# Altium integrated library vh_altium_library.intLib: 963 symbols (part 2 of 5)
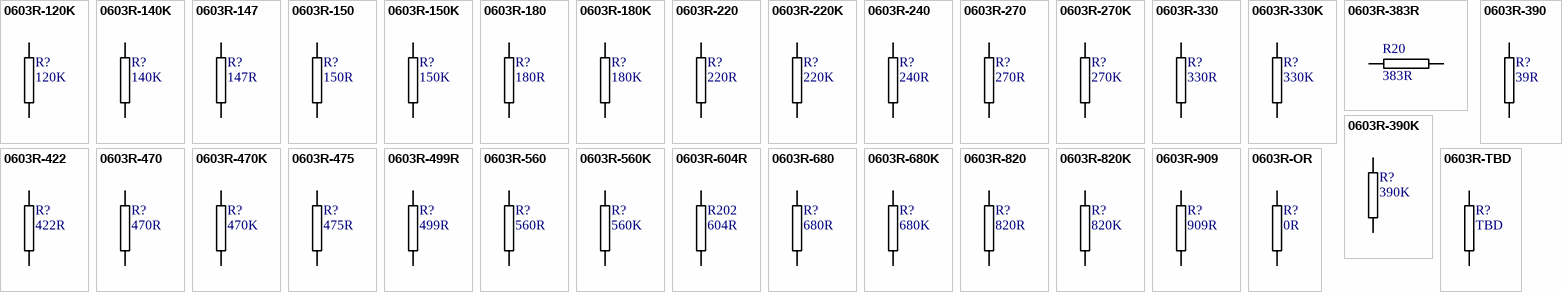
[diagram p69: symbols 0603R-120K to 0603R-TBD]

## 0603R-470K
designator R?, comment 470K
GENERIC RESISTOR 0603; Manufacturer Part Number: RMCF 1/16 470K 1% R; Manufacturer: Stackpole Electronics Inc; Temperature Coefficient: ±100ppm/°C; Description: RES 470K OHM 1/10W 1% 0603 SMD; Tolerance: ±1%; Power (Watts): 0.1W, 1/10W; Supplier 1: Digi-Key; Supplier Part Number 1: RMCF1/16470KFRCT-ND; Supplier Part Number: RMCF1/16470KFRCT-ND; Composition: Thick Film; Category: Resistors; Lead Style: Surface Mount (SMD - SMT); RoHS: RoHS Compliant; Resistance In Ohms: 470K; Case: 0603 (1608 metric); Supplier: Digi-Key; Packaging: Cut Tape (CT)
footprint 0603R-470K (RESISTOR 0603)
pins: 1, 2

## 0603R-475
designator R?, comment 475R
GENERIC RESISTOR 0603; Manufacturer: Stackpole Electronics Inc; Manufacturer Part Number: RMCF 1/16 475 1% R; Description: RES 475 OHM 1/10W 1% 0603 SMD; Temperature Coefficient: ±100ppm/°C; Tolerance: ±1%; Power (Watts): 0.1W, 1/10W; Resistance In Ohms: 475; Reel: R29; Supplier 1: Digi-Key; Supplier Part Number 1: RMCF1/16475FRTR-ND; RoHS: RoHS Compliant; Supplier Part Number: RMCF1/16475FRTR-ND; Category: Resistors; Packaging: Tape & Reel (TR); Lead Style: Surface Mount (SMD - SMT); Supplier: Digi-Key; Case: 0603 (1608 metric); Composition: Thick Film
footprint 0603R-TBD (RESISTOR 0603 VALUE TO BE DETERMINED)
pins: 1, 2

## 0603R-499R
designator R?, comment 499R
GENERIC RESISTOR 0603; Supplier 1: Digi-Key; Supplier Part Number 1: RNCP0603FTD499RTR-ND
footprint 0603R-GENERIC (RESISTOR 0603)
footprint 0603R-NI (RESISTOR 0603 NON INSTALLED)
pins: 1, 2

## 0603R-560
designator R?, comment 560R
GENERIC RESISTOR 0603; Manufacturer: Stackpole Electronics Inc; Manufacturer Part Number: RMC 1/16 560 1% R; Power (Watts): 0.1W, 1/10W; Description: RES TF 1/10W 560 OHM 1% 0603; Resistance In Ohms: 560; Temperature Coefficient: ±100ppm/°C; Tolerance: ±1%; Supplier 1: Digi-Key; Supplier Part Number 1: RMC1/16560FR-ND; Case: 0603 (1608 metric); Lead Style: Surface Mount (SMD - SMT); Composition: Thick Film; Supplier Part Number: RMC1/16560FR-ND; RoHS: RoHS Compliant; Category: Resistors; Supplier: Digi-Key; Packaging: Tape & Reel (TR)
footprint 0603R-560 (RESISTOR 0603)
pins: 1, 2

## 0603R-560K
designator R?, comment 560K
GENERIC RESISTOR 0603; Manufacturer: Stackpole Electronics Inc; Manufacturer Part Number: RMC 1/16 560K 1% R; Temperature Coefficient: ±100ppm/°C; Power (Watts): 0.1W, 1/10W; Tolerance: ±1%; Description: RES TF 1/10W 560K OHM 1% 0603; Supplier 1: Digi-Key; Supplier Part Number 1: RMC1/16560KFR-ND; RoHS: RoHS non-compliant; Packaging: Tape & Reel (TR); Lead Style: Surface Mount (SMD - SMT); Supplier: Digi-Key; Case: 0603 (1608 metric); Supplier Part Number: RMC1/16560KFR-ND; Resistance In Ohms: 560K; Composition: Thick Film; Category: Resistors
footprint 0603R-560K (RESISTOR 0603)
pins: 1, 2

## 0603R-604R
designator R202, comment 604R
GENERIC RESISTOR 0603; REEL: R68; Supplier 1: Digi-Key; Supplier Part Number 1: P604HCT-ND
footprint 0603R-GENERIC (RESISTOR 0603)
pins: 1, 2

## 0603R-680
designator R?, comment 680R
GENERIC RESISTOR 0603; Manufacturer Part Number: RMC 1/16 680 1% R; Manufacturer: Stackpole Electronics Inc; Resistance In Ohms: 680; Description: RES TF 1/10W 680 OHM 1% 0603; Temperature Coefficient: ±100ppm/°C; Tolerance: ±1%; Power (Watts): 0.1W, 1/10W; Supplier 1: Digi-Key; Supplier Part Number 1: RMC1/16680FR-ND; Packaging: Tape & Reel (TR); Supplier: Digi-Key; Composition: Thick Film; Case: 0603 (1608 metric); Category: Resistors; RoHS: RoHS Compliant; Lead Style: Surface Mount (SMD - SMT); Supplier Part Number: RMC1/16680FR-ND
footprint 0603R-680 (RESISTOR 0603)
pins: 1, 2

## 0603R-680K
designator R?, comment 680K
GENERIC RESISTOR 0603; Manufacturer Part Number: RMC 1/16 680K 1% R; Manufacturer: Stackpole Electronics Inc; Description: RES TF 1/10W 680K OHM 1% 0603; Power (Watts): 0.1W, 1/10W; Tolerance: ±1%; Temperature Coefficient: ±100ppm/°C; Supplier 1: Digi-Key; Supplier Part Number 1: RMC1/16680KFR-ND; Case: 0603 (1608 metric); Resistance In Ohms: 680K; Supplier Part Number: RMC1/16680KFR-ND; Composition: Thick Film; Lead Style: Surface Mount (SMD - SMT); Packaging: Tape & Reel (TR); Category: Resistors; Supplier: Digi-Key; RoHS: RoHS Compliant
footprint 0603R-680K (RESISTOR 0603)
pins: 1, 2

## 0603R-820
designator R?, comment 820R
GENERIC RESISTOR 0603; Manufacturer Part Number: RMC 1/16 820 1% R; Manufacturer: Stackpole Electronics Inc; Description: RES TF 1/10W 820 OHM 1% 0603; Power (Watts): 0.1W, 1/10W; Tolerance: ±1%; Resistance In Ohms: 820; Temperature Coefficient: ±100ppm/°C; Supplier 1: Digi-Key; Supplier Part Number 1: RMC1/16820FR-ND; RoHS: RoHS non-compliant; Supplier: Digi-Key; Case: 0603 (1608 metric); Lead Style: Surface Mount (SMD - SMT); Composition: Thick Film; Category: Resistors; Packaging: Tape & Reel (TR); Supplier Part Number: RMC1/16820FR-ND
footprint 0603R-820 (RESISTOR 0603)
pins: 1, 2

## 0603R-820K
designator R?, comment 820K
GENERIC RESISTOR 0603; Manufacturer: Stackpole Electronics Inc; Manufacturer Part Number: RMC 1/16 820K 1% R; Power (Watts): 0.1W, 1/10W; Temperature Coefficient: ±100ppm/°C; Tolerance: ±1%; Description: RES TF 1/10W 820K OHM 1% 0603; Supplier 1: Digi-Key; Supplier Part Number 1: RMC1/16820KFR-ND; Case: 0603 (1608 metric); RoHS: RoHS non-compliant; Supplier Part Number: RMC1/16820KFR-ND; Category: Resistors; Composition: Thick Film; Packaging: Tape & Reel (TR); Lead Style: Surface Mount (SMD - SMT); Resistance In Ohms: 820K; Supplier: Digi-Key
footprint 0603R-GENERIC (RESISTOR 0603)
pins: 1, 2

## 0603R-909
designator R?, comment 909R
GENERIC RESISTOR 0603; Manufacturer: Stackpole Electronics Inc; Manufacturer Part Number: RMC 1/16 909 1% R; Description: RES TF 1/10W 909 OHM 1% 0603; Temperature Coefficient: ±100ppm/°C; Resistance In Ohms: 909; Tolerance: ±1%; Power (Watts): 0.1W, 1/10W; Reel: R25; Supplier 1: Digi-Key; Supplier Part Number 1: RMC1/16909FR-ND; Supplier Part Number: RMC1/16909FR-ND; Category: Resistors; RoHS: RoHS non-compliant; Composition: Thick Film; Lead Style: Surface Mount (SMD - SMT); Packaging: Tape & Reel (TR); Supplier: Digi-Key; Case: 0603 (1608 metric)
footprint 0603R-909 (Footprint not found)
pins: 1, 2

## 0603R-OR
designator R?, comment 0R
GENERIC JUMPER 0603; Manufacturer: Stackpole Electronics Inc; Manufacturer Part Number: RMC 1/16 0 G; Description: RES TF 1/10W 5% 0603; Reel: R26; Supplier 1: Digi-Key; Supplier Part Number 1: RMCF0603ZT0R00TR-ND
footprint 0603R-0R (RESISTOR 0603)
footprint 0603R-NI (RESISTOR 0603 NON INSTALLED)
pins: 1, 2

## 0603R-TBD
designator R?, comment TBD
RESISTOR 0603 VALUE TO BE DETERMINED
footprint 0603R-TBD (RESISTOR 0603 VALUE TO BE DETERMINED)
pins: 1, 2


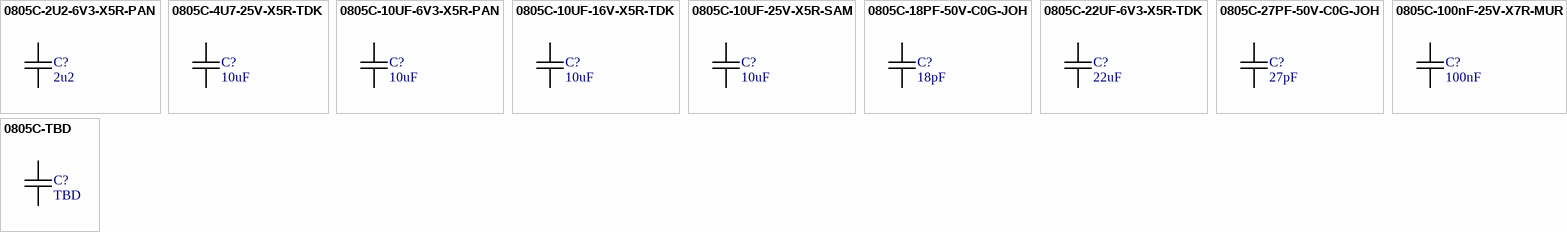
[diagram p8: symbols 0805C-2U2-6V3-X5R-PAN to 0805C-TBD]

## 0805C-2U2-6V3-X5R-PAN
designator C?, comment 2u2
CAPACITOR 0805 CERAMIC; Manufacturer Part Number: ECJ-1VB0J225K; Manufacturer: Panasonic - ECG; Description: CAP 2.2UF 6.3V CERAMIC X5R 0603; Reel: C7; Supplier 1: Digi-Key; Supplier Part Number 1: PCC2273TR-ND
footprint 0805C-GENERIC (CAPACITOR 0805)
pins: 1, 2

## 0805C-4U7-25V-X5R-TDK
designator C?, comment 10uF
CAPACITOR 0805 CERAMIC; Manufacturer: TDK Corporation; Manufacturer Part Number: C2012X5R1E475K; Tolerance: ±10%; Voltage - Rated: 25V; Temperature Coefficient: X5R; Capacitance: 4.7µF; Description: CAP CER 4.7UF 25V X5R 0805; REEL: C102; Supplier 1: Digi-Key; Supplier Part Number 1: 445-4116-1-ND; Packaging: Cut Tape (CT); Operating Temperature: -55°C ~ 85°C; Supplier: Digi-Key; Thickness: 1.25mm; RoHS: RoHS Compliant; Features: General Purpose; Mounting Type: Surface Mount, MLCC; Package / Case: 0805 (2012 Metric); Lead Spacing: -; Category: Capacitors; Supplier Part Number: 445-4116-1-ND
footprint 0805C-GENERIC (CAPACITOR 0805)
pins: 1, 2

## 0805C-10UF-6V3-X5R-PAN
designator C?, comment 10uF
CAPACITOR 0805 CERAMIC; Manufacturer: Panasonic - ECG; Manufacturer Part Number: ECJ-2FB0J106M; Reel: C1; Capacitance: 10µF; Voltage - Rated: 6.3V; Temperature Coefficient: X5R; Tolerance: ±20%; Description: CAP 10UF 6.3V CERAMIC X5R 0805; Supplier 1: Digi-Key; Supplier Part Number 1: PCC2225TR-ND; Supplier: Digi-Key; Operating Temperature: -55°C ~ 85°C; Mounting Type: Surface Mount, MLCC; Lead Spacing: -; RoHS: RoHS Compliant; Packaging: Tape & Reel (TR); Thickness: 1.25mm; Package / Case: 0805 (2012 metric); Features: General Purpose; Category: Capacitors; Supplier Part Number: PCC2225TR-ND
footprint 0805C-GENERIC (CAPACITOR 0805)
pins: 1, 2

## 0805C-10UF-16V-X5R-TDK
designator C?, comment 10uF
CAPACITOR 0805 CERAMIC; Manufacturer Part Number: C2012X5R1C106M; Manufacturer: TDK Corporation; REEL: C63; Description: CAP CER 10UF 16V X5R 0805; Supplier 1: Digi-Key; Supplier Part Number 1: 445-4115-2-ND
footprint 0805C-GENERIC (CAPACITOR 0805)
pins: 1, 2

## 0805C-10UF-25V-X5R-SAM
designator C?, comment 10uF
CAPACITOR 0805 CERAMIC; Manufacturer 1: Samsung; Manufacturer Part Number 1: CL21A106KACLRNC; Reel: C19; Supplier Part Number 1: CL21A106KACLRNC; Supplierr 1: Samsung
footprint 0805C-GENERIC (CAPACITOR 0805)
pins: 1, 2

## 0805C-18PF-50V-C0G-JOH
designator C?, comment 18pF
CAPACITOR 0805 CERAMIC; Supplier 1: Digi-Key; Supplier Part Number 1: 709-1171-2-ND
footprint 0805C-TBD (CAPACITOR 0805)
pins: 1, 2

## 0805C-22UF-6V3-X5R-TDK
designator C?, comment 22uF
CAPACITOR 0805 CERAMIC; Manufacturer: TDK Corporation; Manufacturer Part Number: C2012X5R0J226M; Tolerance: ±20%; Capacitance: 22µF; Description: CAP CER 22UF 6.3V X5R 20% 0805; Temperature Coefficient: X5R; Voltage - Rated: 6.3V; Supplier 1: Digi-Key; Supplier Part Number 1: 445-1422-2-ND; Operating Temperature: -55°C ~ 85°C; Mounting Type: Surface Mount, MLCC; RoHS: RoHS Compliant; Packaging: Tape & Reel (TR); Features: General Purpose; Lead Spacing: -; Category: Capacitors; Thickness: 1.25mm; Package / Case: 0805 (2012 Metric); Supplier Part Number: 445-1422-2-ND; Supplier: Digi-Key
footprint 0805C-GENERIC (CAPACITOR 0805)
pins: 1, 2

## 0805C-27PF-50V-C0G-JOH
designator C?, comment 27pF
CAPACITOR 0805 CERAMIC; Supplier 1: Digi-Key; Supplier 2: Digi-Key; Supplier Part Number 2: 251R15S270FV4E-ND
footprint 0805C-TBD (CAPACITOR 0805)
pins: 1, 2

## 0805C-100nF-25V-X7R-MUR
designator C?, comment 100nF
CAPACITOR 0805 CERAMIC; Supplier 1: Digi-Key; Supplier Part Number 1: 490-1673-1-ND
footprint 0805C-TBD (CAPACITOR 0805)
pins: 1, 2

## 0805C-TBD
designator C?, comment TBD
CAPACITOR 0805 CERAMIC VALUE TO BE DETERMINED
footprint 0805C-TBD (CAPACITOR 0805)
pins: 1, 2


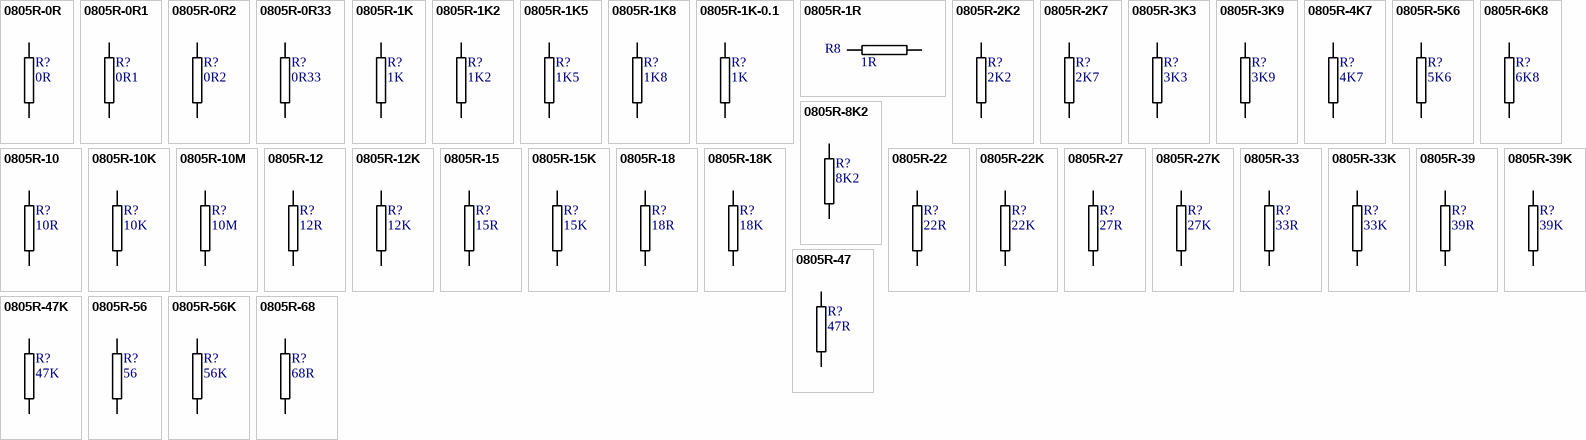
[diagram p9: symbols 0805R-0R to 0805R-68]

## 0805R-0R
designator R?, comment 0R
RESISTOR 0805 1 WATT
footprint 0805R-GENERIC (RESISTOR 0805)
pins: 1, 2

## 0805R-0R1
designator R?, comment 0R1
RESISTOR 0805 1 WATT; Manufacturer Part Number: RL1220S-R10-F; Manufacturer: Susumu; Description: RES .10 OHM 1/4W 1% 0805 SMD; Reel: *; Supplier 1: Digi-Key; Supplier Part Number 1: RL12S.10FTR-ND
footprint 0805R-0R1 (Footprint not found)
pins: 1, 2

## 0805R-0R2
designator R?, comment 0R2
RESISTOR 0805 1 WATT; Reel: *; Supplier 1: Digi-Key; Supplier Part Number 1: 311-.20STR-ND
footprint 0805R-0R1 (Footprint not found)
pins: 1, 2

## 0805R-0R33
designator R?, comment 0R33
RESISTOR 0805 1 WATT; Reel: *; Supplier 1: Digi-Key; Supplier Part Number 1: 311-.33STR-ND
footprint 0805R-0R1 (Footprint not found)
pins: 1, 2

## 0805R-1K
designator R?, comment 1K
RESISTOR 0805 1/4 WATT THIN FILM; Reel: *
footprint 0805R-1K (RESISTOR 0805)
pins: 1, 2

## 0805R-1K2
designator R?, comment 1K2
RESISTOR 0805 1/4 WATT THIN FILM; Reel: *
footprint 0805R-1K2 (RESISTOR 0805)
pins: 1, 2

## 0805R-1K5
designator R?, comment 1K5
RESISTOR 0805 1/4 WATT THIN FILM; Reel: *
footprint 0805R-1K5 (RESISTOR 0805)
pins: 1, 2

## 0805R-1K8
designator R?, comment 1K8
RESISTOR 0805 1/4 WATT THIN FILM; Reel: *
footprint 0805R-1K8 (RESISTOR 0805)
pins: 1, 2

## 0805R-1K-0.1
designator R?, comment 1K
RESISTOR 0805 1/4 WATT THIN FILM 0.1%; Reel: *
footprint 0805R-1K (RESISTOR 0805)
pins: 1, 2

## 0805R-1R
designator R8, comment 1R
RESISTOR 0805 1/3 WATT; REEL: R84; Supplier 1: Digi-Key; Supplier Part Number 1: 541-1.0TADKR-ND
footprint 0805R-GENERIC (RESISTOR 0805)
pins: 1, 2

## 0805R-2K2
designator R?, comment 2K2
RESISTOR 0805 1/4 WATT THIN FILM; Reel: *
footprint 0805R-2K2 (RESISTOR 0805)
pins: 1, 2

## 0805R-2K7
designator R?, comment 2K7
RESISTOR 0805 1/4 WATT THIN FILM; Reel: *
footprint 0805R-2K7 (RESISTOR 0805)
pins: 1, 2

## 0805R-3K3
designator R?, comment 3K3
RESISTOR 0805 1/4 WATT THIN FILM; Reel: *
footprint 0805R-3K3 (RESISTOR 0805)
pins: 1, 2

## 0805R-3K9
designator R?, comment 3K9
RESISTOR 0805 1/4 WATT THIN FILM; Reel: *
footprint 0805R-3K9 (RESISTOR 0805)
pins: 1, 2

## 0805R-4K7
designator R?, comment 4K7
RESISTOR 0805 1/4 WATT THIN FILM; Reel: *
footprint 0805R-4K7 (RESISTOR 0805)
pins: 1, 2

## 0805R-5K6
designator R?, comment 5K6
RESISTOR 0805 1/4 WATT THIN FILM; Reel: *
footprint 0805R-5K6 (RESISTOR 0805)
pins: 1, 2

## 0805R-6K8
designator R?, comment 6K8
RESISTOR 0805 1/4 WATT THIN FILM; Reel: *
footprint 0805R-6K8 (RESISTOR 0805)
pins: 1, 2

## 0805R-8K2
designator R?, comment 8K2
RESISTOR 0805 1/4 WATT THIN FILM; Reel: *
footprint 0805R-8K2 (RESISTOR 0805)
pins: 1, 2

## 0805R-10
designator R?, comment 10R
RESISTOR 0805 1/4 WATT THIN FILM; Reel: *
footprint 0805R-10 (RESISTOR 0805)
pins: 1, 2

## 0805R-10K
designator R?, comment 10K
RESISTOR 0805 1/4 WATT THIN FILM; Reel: *
footprint 0805R-10K (RESISTOR 0805)
pins: 1, 2

## 0805R-10M
designator R?, comment 10M
RESISTOR 0805 VALUE TO BE DETERMINED; Supplier 1: Digi-Key; Supplier Part Number 1: HVCB0805FKL10M0-ND
footprint 0805R-TBD (RESISTOR 0805 VALUE TO BE DETERMINED)
pins: 1, 2

## 0805R-12
designator R?, comment 12R
RESISTOR 0805 1/4 WATT THIN FILM; Reel: *
footprint 0805R-12 (RESISTOR 0805)
pins: 1, 2

## 0805R-12K
designator R?, comment 12K
RESISTOR 0805 1/4 WATT THIN FILM; Reel: *
footprint 0805R-12K (RESISTOR 0805)
pins: 1, 2

## 0805R-15
designator R?, comment 15R
RESISTOR 0805 1/4 WATT THIN FILM; Reel: *
footprint 0805R-15 (RESISTOR 0805)
pins: 1, 2

## 0805R-15K
designator R?, comment 15K
RESISTOR 0805 1/4 WATT THIN FILM; Reel: *
footprint 0805R-15K (RESISTOR 0805)
pins: 1, 2

## 0805R-18
designator R?, comment 18R
RESISTOR 0805 1/4 WATT THIN FILM; Reel: *
footprint 0805R-18 (RESISTOR 0805)
pins: 1, 2

## 0805R-18K
designator R?, comment 18K
RESISTOR 0805 1/4 WATT THIN FILM; Reel: *
footprint 0805R-18K (RESISTOR 0805)
pins: 1, 2

## 0805R-22
designator R?, comment 22R
RESISTOR 0805 1/4 WATT THIN FILM; Reel: *
footprint 0805R-22 (RESISTOR 0805)
pins: 1, 2

## 0805R-22K
designator R?, comment 22K
RESISTOR 0805 1/4 WATT THIN FILM; Reel: *
footprint 0805R-22K (RESISTOR 0805)
pins: 1, 2

## 0805R-27
designator R?, comment 27R
RESISTOR 0805 1/4 WATT THIN FILM; Reel: *
footprint 0805R-27 (RESISTOR 0805)
pins: 1, 2

## 0805R-27K
designator R?, comment 27K
RESISTOR 0805 1/4 WATT THIN FILM; Reel: *
footprint 0805R-27K (RESISTOR 0805)
pins: 1, 2

## 0805R-33
designator R?, comment 33R
RESISTOR 0805 1/4 WATT THIN FILM; Reel: *
footprint 0805R-33 (RESISTOR 0805)
pins: 1, 2

## 0805R-33K
designator R?, comment 33K
RESISTOR 0805 1/4 WATT THIN FILM; Reel: *
footprint 0805R-33K (RESISTOR 0805)
pins: 1, 2

## 0805R-39
designator R?, comment 39R
RESISTOR 0805 1/4 WATT THIN FILM; Reel: *
footprint 0805R-39 (RESISTOR 0805)
pins: 1, 2

## 0805R-39K
designator R?, comment 39K
RESISTOR 0805 1/4 WATT THIN FILM; Reel: R85; Supplier 1: Digi-Key; Supplier Part Number 1: P39.0KHTR-ND
footprint 0805R-39K (RESISTOR 0805)
pins: 1, 2

## 0805R-47
designator R?, comment 47R
RESISTOR 0805 1/4 WATT THIN FILM; Reel: *
footprint 0805R-47 (RESISTOR 0805)
pins: 1, 2

## 0805R-47K
designator R?, comment 47K
RESISTOR 0805 1/4 WATT THIN FILM
footprint 0805R-47K (RESISTOR 0805)
pins: 1, 2

## 0805R-56
designator R?, comment 56
RESISTOR 0805 1/4 WATT THIN FILM; Reel: *
footprint 0805R-56 (RESISTOR 0805)
pins: 1, 2

## 0805R-56K
designator R?, comment 56K
RESISTOR 0805 1/4 WATT THIN FILM; Reel: *
footprint 0805R-56K (RESISTOR 0805)
pins: 1, 2

## 0805R-68
designator R?, comment 68R
RESISTOR 0805 1/4 WATT THIN FILM; Reel: *
footprint 0805R-68 (RESISTOR 0805)
pins: 1, 2

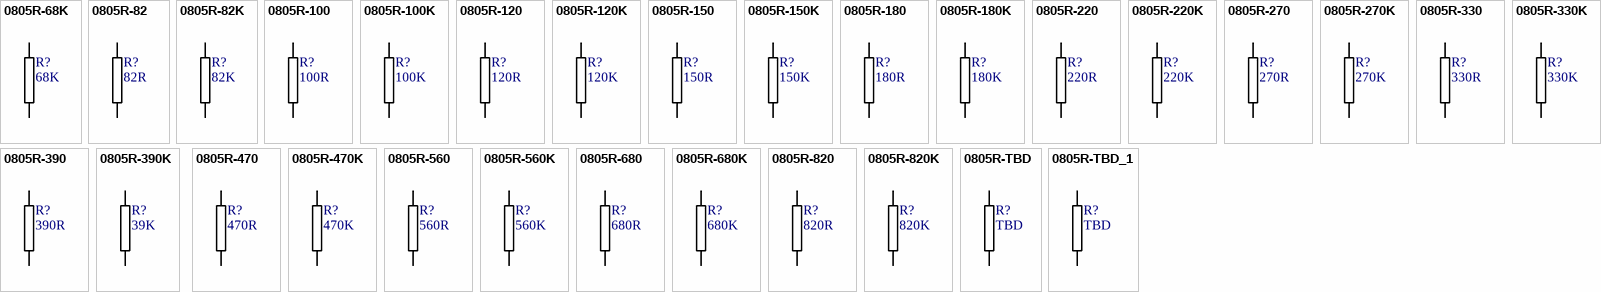
[diagram p10: symbols 0805R-68K to 0805R-TBD_1]

## 0805R-68K
designator R?, comment 68K
RESISTOR 0805 1/4 WATT THIN FILM; Reel: *
footprint 0805R-68K (RESISTOR 0805)
pins: 1, 2

## 0805R-82
designator R?, comment 82R
RESISTOR 0805 1/4 WATT THIN FILM; Reel: *
footprint 0805R-82K (RESISTOR 0805)
pins: 1, 2

## 0805R-82K
designator R?, comment 82K
RESISTOR 0805 1/4 WATT THIN FILM; Reel: *
footprint 0805R-82K (RESISTOR 0805)
pins: 1, 2

## 0805R-100
designator R?, comment 100R
RESISTOR 0805 1/4 WATT THIN FILM; Reel: *
footprint 0805R-100 (RESISTOR 0805)
pins: 1, 2

## 0805R-100K
designator R?, comment 100K
RESISTOR 0805 1/4 WATT THIN FILM; Reel: *; Supplier 1: Digi-Key; Supplier Part Number 1: RMCF0805FT100KTR-ND
footprint 0805R-100K (RESISTOR 0805)
pins: 1, 2

## 0805R-120
designator R?, comment 120R
RESISTOR 0805 1/4 WATT THIN FILM; Reel: *
footprint 0805R-120 (RESISTOR 0805)
pins: 1, 2

## 0805R-120K
designator R?, comment 120K
RESISTOR 0805 1/4 WATT THIN FILM; Reel: *
footprint 0805R-120K (RESISTOR 0805)
pins: 1, 2

## 0805R-150
designator R?, comment 150R
RESISTOR 0805 1/4 WATT THIN FILM; Reel: *
footprint 0805R-150 (RESISTOR 0805)
pins: 1, 2

## 0805R-150K
designator R?, comment 150K
RESISTOR 0805 1/4 WATT THIN FILM; Reel: *
footprint 0805R-150K (RESISTOR 0805)
pins: 1, 2

## 0805R-180
designator R?, comment 180R
RESISTOR 0805 1/4 WATT THIN FILM; Reel: *
footprint 0805R-180 (RESISTOR 0805)
pins: 1, 2

## 0805R-180K
designator R?, comment 180K
RESISTOR 0805 1/4 WATT THIN FILM; Reel: *
footprint 0805R-180K (RESISTOR 0805)
pins: 1, 2

## 0805R-220
designator R?, comment 220R
RESISTOR 0805 1/4 WATT THIN FILM; Reel: *
footprint 0805R-220 (RESISTOR 0805)
pins: 1, 2

## 0805R-220K
designator R?, comment 220K
RESISTOR 0805 1/4 WATT THIN FILM; Reel: *
footprint 0805R-220K (RESISTOR 0805)
pins: 1, 2

## 0805R-270
designator R?, comment 270R
RESISTOR 0805 1/4 WATT THIN FILM; Reel: *
footprint 0805R-270 (RESISTOR 0805)
pins: 1, 2

## 0805R-270K
designator R?, comment 270K
RESISTOR 0805 1/4 WATT THIN FILM; Reel: *
footprint 0805R-270K (RESISTOR 0805)
pins: 1, 2

## 0805R-330
designator R?, comment 330R
RESISTOR 0805 1/4 WATT THIN FILM; Reel: *
footprint 0805R-330 (RESISTOR 0805)
pins: 1, 2

## 0805R-330K
designator R?, comment 330K
RESISTOR 0805 1/4 WATT THIN FILM; Reel: *
footprint 0805R-330K (RESISTOR 0805)
pins: 1, 2

## 0805R-390
designator R?, comment 390R
RESISTOR 0805 1/4 WATT THIN FILM; Reel: *
footprint 0805R-390 (RESISTOR 0805)
pins: 1, 2

## 0805R-390K
designator R?, comment 39K
RESISTOR 0805 1/4 WATT THIN FILM; Reel: *
footprint 0805R-390K (RESISTOR 0805)
pins: 1, 2

## 0805R-470
designator R?, comment 470R
RESISTOR 0805 1/4 WATT THIN FILM; Reel: *
footprint 0805R-470 (RESISTOR 0805)
pins: 1, 2

## 0805R-470K
designator R?, comment 470K
RESISTOR 0805 1/4 WATT THIN FILM; Reel: *
footprint 0805R-470K (RESISTOR 0805)
pins: 1, 2

## 0805R-560
designator R?, comment 560R
RESISTOR 0805 1/4 WATT THIN FILM; Reel: *
footprint 0805R-560 (RESISTOR 0805)
pins: 1, 2

## 0805R-560K
designator R?, comment 560K
RESISTOR 0805 1/4 WATT THIN FILM; Reel: *
footprint 0805R-560K (RESISTOR 0805)
pins: 1, 2

## 0805R-680
designator R?, comment 680R
RESISTOR 0805 1/4 WATT THIN FILM; Reel: *
footprint 0805R-680 (RESISTOR 0805)
pins: 1, 2

## 0805R-680K
designator R?, comment 680K
RESISTOR 0805 1/4 WATT THIN FILM; Reel: *
footprint 0805R-680K (RESISTOR 0805)
pins: 1, 2

## 0805R-820
designator R?, comment 820R
RESISTOR 0805 1/4 WATT THIN FILM; Reel: *
footprint 0805R-820 (RESISTOR 0805)
pins: 1, 2

## 0805R-820K
designator R?, comment 820K
RESISTOR 0805 1/4 WATT THIN FILM; Reel: *
footprint 0805R-820K (RESISTOR 0805)
pins: 1, 2

## 0805R-TBD
designator R?, comment TBD
RESISTOR 0805 VALUE TO BE DETERMINED
footprint 0805R-TBD (RESISTOR 0805 VALUE TO BE DETERMINED)
pins: 1, 2

## 0805R-TBD_1
designator R?, comment TBD
RESISTOR 0805 VALUE TO BE DETERMINED
footprint 0805R-TBD (RESISTOR 0805 VALUE TO BE DETERMINED)
pins: 1, 2


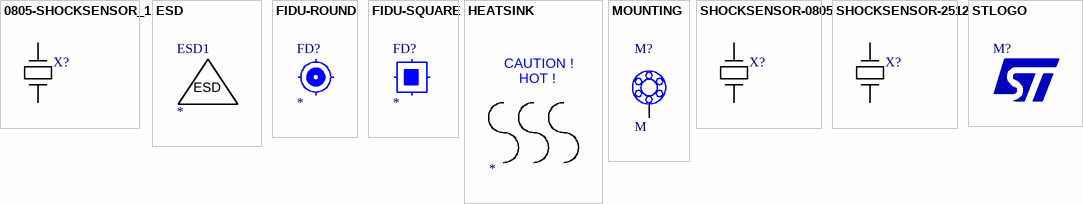
[diagram p11: symbols 0805-SHOCKSENSOR_1 to STLOGO]

## 0805-SHOCKSENSOR_1
designator X?
DO NOT USE : USE SHOCKSENSOR-0805 SYMBOL
footprint 0805-SHOCKSENSOR (SHOCKSENSOR)
pins: 1, 2

## ESD
designator ESD1  (no BOM)
ESD LOGO
footprint ESDSILK

## FIDU-ROUND
designator FD?  (no BOM)
ROUND FIDUCIAL
footprint FIDU-ROUND

## FIDU-SQUARE
designator FD?  (no BOM)
SQUARE FIDUCIAL
footprint FIDU-SQUARE

## HEATSINK
designator ?
text: CAUTION !; HOT !

## MOUNTING
designator M?, comment M  (no BOM)
MOUNTING HOLE - NON INSTALLABLE
footprint MOUNTING
pins: 1, 2, 3, 4, 5, 6, 7

## SHOCKSENSOR-0805
designator X?
SHOCK SENSOR
footprint SHOCKSENSOR-0805 (SHOCKSENSOR)
pins: 1, 2

## SHOCKSENSOR-2512
designator X?
SHOCK SENSOR
footprint SHOCKSENSOR-2512 (SHOCKSENSOR)
pins: 1, 2

## STLOGO
designator M?  (value not drawn)  (no BOM)
footprint STLOGO-SILVER
footprint STLOGO-MINI-SILVER


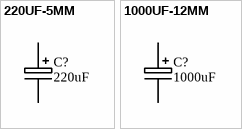
[diagram p12: symbols 220UF-5MM to 1000UF-12MM]

## 220UF-5MM
designator C?, comment 220uF
CAPACITOR POLARISED
footprint C+5MM
pins: +, -

## 1000UF-12MM
designator C?, comment 1000uF
CAPACITOR POLARISED
footprint C+12MM
pins: +, -


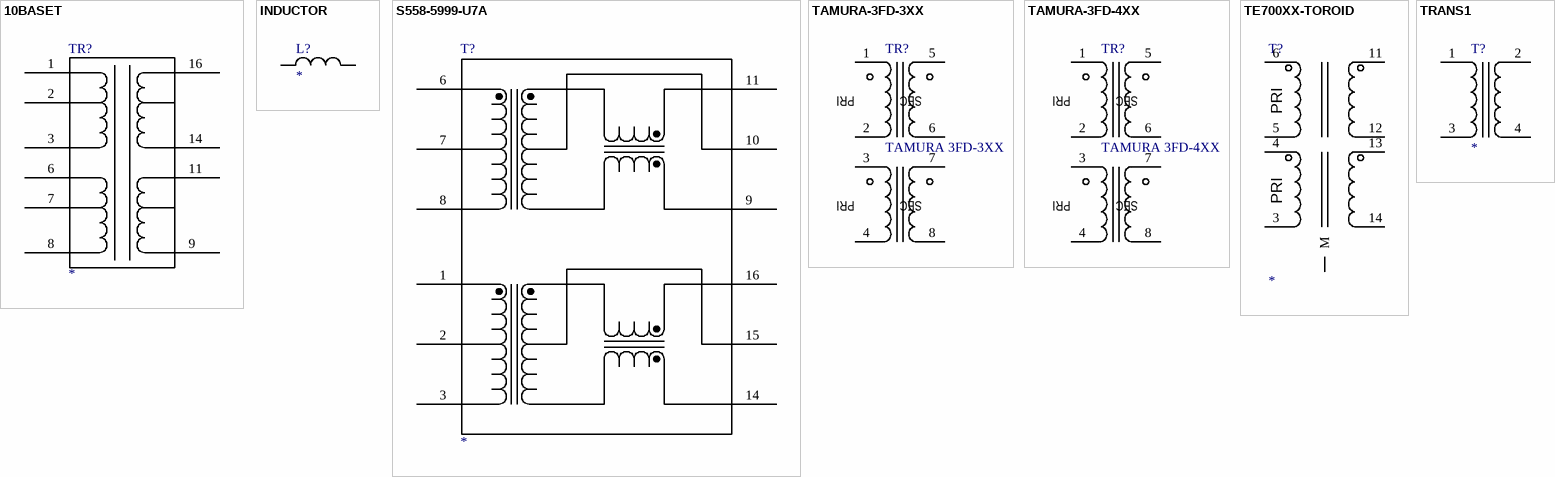
[diagram p13: symbols 10BASET to TRANS1]

## 10BASET
designator TR?
THERNET TRANSFORMER
pins: 1, 2, 3, 6, 7, 8, 9, 11, 14, 16

## INDUCTOR
designator L?
INDUCTOR
pins: 1, 2

## S558-5999-U7A
designator T?
Magnetics, 10/100Base-T, 1CT:1CT Tx and Rx; Supplier 1: Digi-Key; Supplier Part Number 1: 507-1463-2-ND
pins: 1, 2, 3, 6, 7, 8, 9, 10, 11, 14, 15, 16

## TAMURA-3FD-3XX
designator TR?, comment TAMURA 3FD-3XX
footprint TAMURA-3FD-3XX
pins: 1, 2, 3, 4, 5, 6, 7, 8
text: PRI; SEC

## TAMURA-3FD-4XX
designator TR?, comment TAMURA 3FD-4XX
footprint TAMURA-3FD-4XX
pins: 1, 2, 3, 4, 5, 6, 7, 8
text: PRI; SEC

## TE700XX-TOROID
designator T?
AMVECO POTTED TOROIDAL TRANSFORMER
footprint TE70035
pins: 3, 4, 5, 6, 11, 12, 13, 14, M
text: PRI

## TRANS1
designator T?
pins: 1, 2, 3, 4


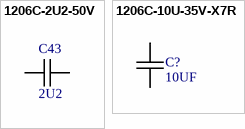
[diagram p14: symbols 1206C-2U2-50V to 1206C-10U-35V-X7R]

## 1206C-2U2-50V
designator C43, comment 2U2
CAPACITOR 0603 CERAMIC; REEL: C100; Supplier 1: Digi-Key; Supplier Part Number 1: 490-4796-2-ND
footprint 1206C-GENERIC
pins: 1, 2

## 1206C-10U-35V-X7R
designator C?, comment 10UF
GENERIC CAPACITOR NON POLARISED 1206; Manufacturer Part Number: GMK316F106ZL-T; Manufacturer: Taiyo Yuden; Reel: C90; Description: CAP CER 10UF 35V Y5V 1206; Supplier 1: Digi-Key; Supplier Part Number 1: 587-1352-2-ND
footprint 1206C-GENERIC
pins: 1, 2


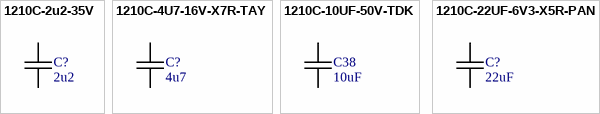
[diagram p15: symbols 1210C-2u2-35V to 1210C-22UF-6V3-X5R-PAN]

## 1210C-2u2-35V
designator C?, comment 2u2
GENERIC CAPACITOR NON POLARISED 1210; Manufacturer: Panasonic - ECG; Manufacturer Part Number: ECJ-4YB0J226M; Reel: C25; Description: CAP 22UF 6.3V CERAMIC 1210 X5R; Supplier 1: Digi-Key; Supplier Part Number 1: 587-2255-2-ND
footprint 1210C-GENERIC
pins: 1, 2

## 1210C-4U7-16V-X7R-TAY
designator C?, comment 4u7
GENERIC CAPACITOR NON POLARISED 1210; Manufacturer: Taiyo Yuden; Manufacturer Part Number: EMK325B7475KN-T; Reel: C38; Description: CAP CER 4.7UF 16V X7R 1210; Supplier 1: Digi-Key; Supplier Part Number 1: 587-1392-2-ND
footprint 1210C-GENERIC
pins: 1, 2

## 1210C-10UF-50V-TDK
designator C38, comment 10uF
GENERIC CAPACITOR NON POLARISED 1210; REEL: C87; Supplier 1: Digi-Key; Supplier Part Number 1: 445-4537-2-ND
footprint 1210C-GENERIC
pins: 1, 2

## 1210C-22UF-6V3-X5R-PAN
designator C?, comment 22uF
GENERIC CAPACITOR NON POLARISED 1210; Manufacturer: Panasonic - ECG; Manufacturer Part Number: ECJ-4YB0J226M; Reel: C25; Description: CAP 22UF 6.3V CERAMIC 1210 X5R; Supplier 1: Digi-Key; Supplier Part Number 1: PCC2179TR-ND
footprint 1210C-GENERIC
pins: 1, 2


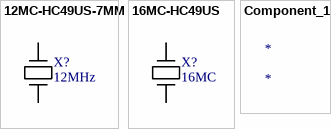
[diagram p16: symbols 12MC-HC49US-7MM to Component_1]

## 12MC-HC49US-7MM
designator X?, comment 12MHz
12MHz CRYSTAL HC49US SHORT BODY; Supplier 1: Mouser; Supplier Part Number 1: 520-120-20-3XT
footprint XTAL-HC49US-7MM (Footprint not found)
pins: 1, 2

## 16MC-HC49US
designator X?, comment 16MC
16MHZ CRSYTAL HC49US; Supplier 1: Mouser; Supplier Part Number 1: 815-ABLS-16.0M-T
footprint XTAL-RU49/4
pins: 1, 2

## Component_1
designator *


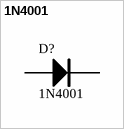
[diagram p17: symbol 1N4001]

## 1N4001
designator D?
footprint 1N400X
pins: A, K


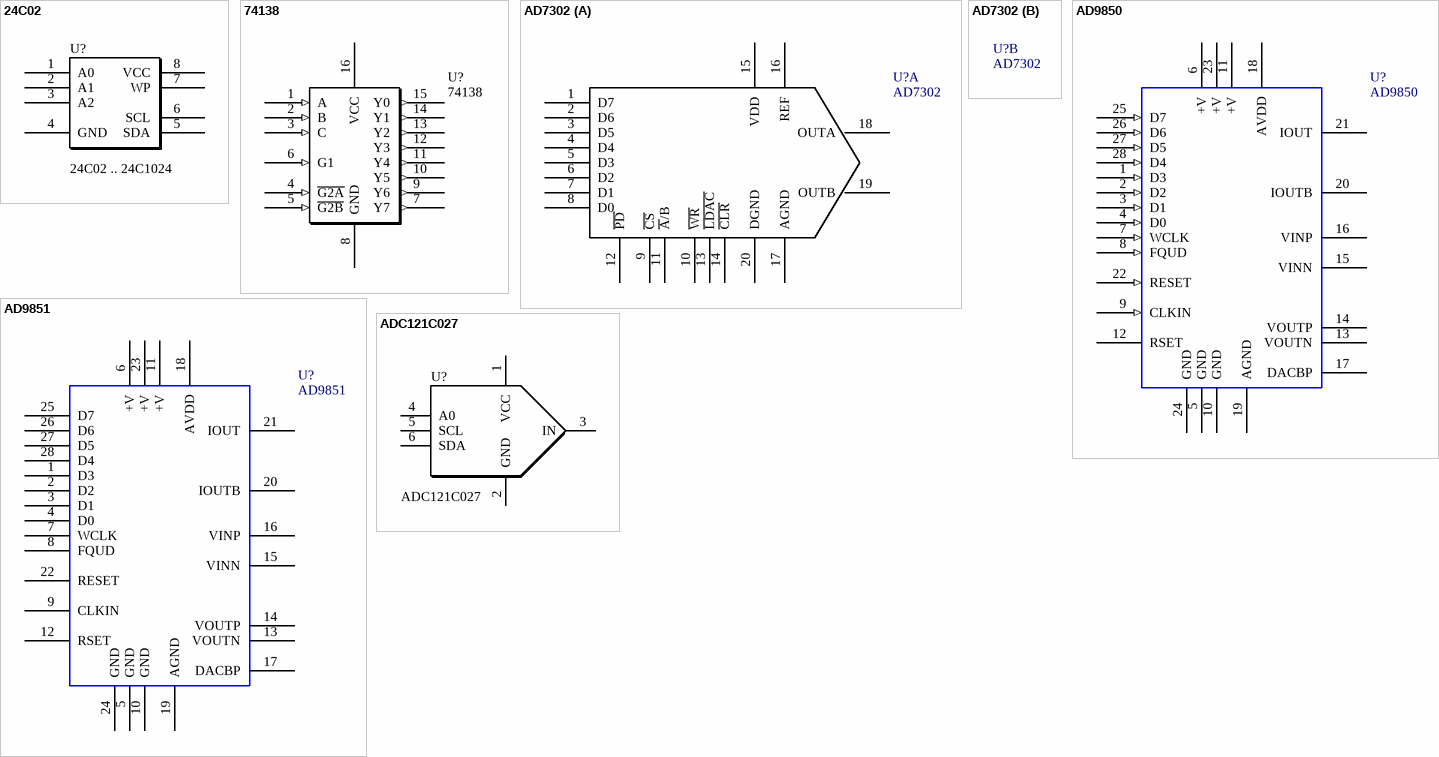
[diagram p18: symbols 24C02 to ADC121C027]

## 24C02
designator U?, comment 24C02 .. 24C1024
footprint SO8
pins: 1 A0, 2 A1, 3 A2, 4 GND, 5 SDA, 6 SCL, 7 WP, 8 VCC

## 74138
designator U?
3-Line to 8-Line Decoders/Demultiplexers
footprint SO16W
footprint SO16
pins: 1 A (in), 2 B (in), 3 C (in), 4 ~{G2A} (in), 5 ~{G2B} (in), 6 G1 (in), 7 Y7 (out), 8 GND (power), 9 Y6 (out), 10 Y5 (out), 11 Y4 (out), 12 Y3 (out), 13 Y2 (out), 14 Y1 (out), 15 Y0 (out), 16 VCC (power)

## AD7302
designator U?
DUAL 8 BIT DAC; Manufacturer: Analog Devices Inc; Manufacturer Part Number: AD7302BRZ; Voltage Supply Source: Single Supply; Power Dissipation (Max): 24.8mW; Number of Converters: 2; Number of Outputs and Type: 2 Voltage, Unipolar; 2 Voltage, Bipolar; Description: IC DAC 8BIT DUAL R-R 20-SOIC; Settling Time: 1.2µs; Data Interface: Parallel; Number of Bits: 8; Supplier 1: Digi-Key; Supplier Part Number 1: AD7302BRZ-ND; Operating Temperature: -40°C ~ 105°C; Category: Integrated Circuits (ICs); Supplier: Digi-Key; Supplier Part Number: AD7302BRZ-ND; RoHS: RoHS Compliant; Package / Case: 20-SOIC (7.5mm Width); Packaging: Tube
footprint SO20
part A pins: 1 D7, 2 D6, 3 D5, 4 D4, 5 D3, 6 D2, 7 D1, 8 D0, 9 ~{CS}, 10 ~{WR}, 11 ~{A}/B, 12 ~{PD}, 13 ~{LDAC}, 14 ~{CLR}, 15 VDD, 16 REF, 17 AGND, 18 OUTA, 19 OUTB, 20 DGND

## AD9850
designator U?
180 MHz DDS SYNTHESIZER; Manufacturer: Analog Devices Inc; Manufacturer Part Number: AD9850BRSZ; Description: IC DDS SYNTHESIZER CMOS 28-SSOP; Voltage - Supply: 3.3V, 5V; Tuning Word Width (Bits): 32 b; Resolution (Bits): 10 b; Master fclk: 125MHz; Supplier 1: Digi-Key; Supplier Part Number 1: AD9850BRSZ-ND; Package / Case: 28-SSOP; RoHS: RoHS Compliant; Packaging: Tube; Supplier Part Number: AD9850BRSZ-ND; Category: Integrated Circuits (ICs); Supplier: Digi-Key; Operating Temperature: -40°C ~ 85°C
footprint TSSOP28
pins: 1 D3 (in), 2 D2 (in), 3 D1 (in), 4 D0 (in), 5 GND (power), 6 +V (power), 7 WCLK (in), 8 FQUD (in), 9 CLKIN (in), 10 GND (power), 11 +V (power), 12 RSET, 13 VOUTN, 14 VOUTP, 15 VINN, 16 VINP, 17 DACBP, 18 AVDD (power), 19 AGND (power), 20 IOUTB, 21 IOUT, 22 RESET (in), 23 +V (power), 24 GND (power), 25 D7 (in), 26 D6 (in), 27 D5 (in), 28 D4 (in)

## AD9851
designator U?
180 MHz DDS SYNTHESIZER; Manufacturer: Analog Devices Inc; Manufacturer Part Number: AD9851BRS; Description: IC DDS DAC W/COMP 180MHZ 28-SSOP; Tuning Word Width (Bits): 32 b; Resolution (Bits): 10 b; Voltage - Supply: 2.7 V ~ 5.25 V; Master fclk: 180MHz; Supplier 1: Digi-Key; Supplier Part Number 1: AD9851BRS-ND; Packaging: Tube; Supplier Part Number: AD9851BRS-ND; Package / Case: 28-SSOP; RoHS: RoHS non-compliant; Supplier: Digi-Key; Operating Temperature: -40°C ~ 85°C; Category: Integrated Circuits (ICs)
footprint TSSOP28
pins: 1 D3, 2 D2, 3 D1, 4 D0, 5 GND, 6 +V, 7 WCLK, 8 FQUD, 9 CLKIN, 10 GND, 11 +V, 12 RSET, 13 VOUTN, 14 VOUTP, 15 VINN, 16 VINP, 17 DACBP, 18 AVDD, 19 AGND, 20 IOUTB, 21 IOUT, 22 RESET, 23 +V, 24 GND, 25 D7, 26 D6, 27 D5, 28 D4

## ADC121C027
designator U?
12 BIT ADC WITH I2C INTERFACE
footprint SOT23-6
pins: 1 VCC, 2 GND, 3 IN, 4 A0, 5 SCL, 6 SDA
